# Altium schematic symbol library jlcpcb_2025_04_resistors_extended_0201.schlib: 1508 symbols (part 2 of 8)
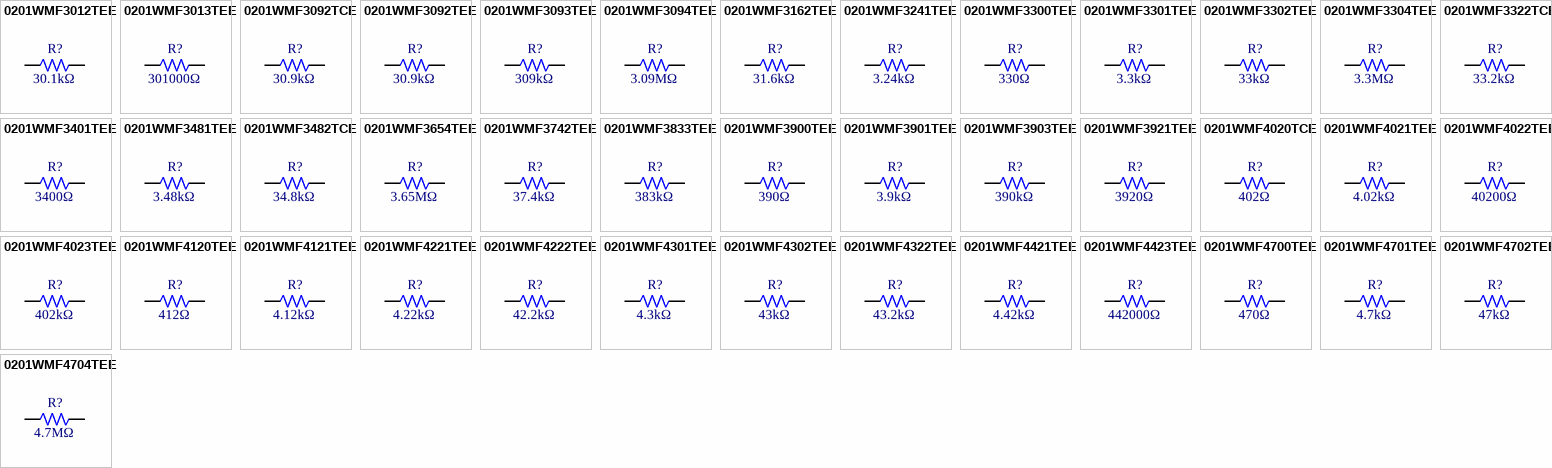
[diagram p38: symbols 0201WMF3012TEE to 0201WMF4704TEE]

## 0201WMF4421TEE
designator R?  Resistance: 4.42kΩ  (hidden comment: *)
Resistor, 4.42kΩ, ±1%, 50mW, 25V, ±200ppm/℃, -55℃~+155℃, SMD 0201; Manufacturer: Uniroyal; Manufacturer Part Number: 0201WMF4421TEE; Supplier 1: LCSC; Supplier Part Number 1: C423515; JLCPCB Part Number: C423515; Power Rating: 50mW; Category: Resistors; Package Size: 0201; JLCPCB Basic Part: Yes; Tolerance: ±1%; Voltage Rating: 25V; Temperature Coefficient: ±200ppm/℃; Temperature Rating: -55℃~+155℃; ComponentLink1Description: Datasheet; ComponentLink1URL: https://wmsc.lcsc.com/wmsc/upload/file/pdf/v2/lcsc/2205312145_UNI-ROYAL-Uniroyal-Elec-0201WMF4421TEE_C423515.pdf; ComponentLink2Description: JLCPCB Part URL; ComponentLink2URL: https://jlcpcb.com/partdetail/C423515
pins: 1, 2
1 alternate drawing of the same symbol

## 0201WMF4423TEE
designator R?  Resistance: 442000Ω  (hidden comment: *)
Resistor, 442000Ω, ±1%, 50mW, 25V, ±200ppm/℃, -55℃~+155℃, SMD 0201; Manufacturer: Uniroyal; Manufacturer Part Number: 0201WMF4423TEE; Supplier 1: LCSC; Supplier Part Number 1: C423513; JLCPCB Part Number: C423513; Power Rating: 50mW; Category: Resistors; Package Size: 0201; JLCPCB Basic Part: Yes; Tolerance: ±1%; Voltage Rating: 25V; Temperature Coefficient: ±200ppm/℃; Temperature Rating: -55℃~+155℃; ComponentLink1Description: Datasheet; ComponentLink1URL: https://wmsc.lcsc.com/wmsc/upload/file/pdf/v2/lcsc/2206011100_UNI-ROYAL-Uniroyal-Elec-0201WMF4423TEE_C423513.pdf; ComponentLink2Description: JLCPCB Part URL; ComponentLink2URL: https://jlcpcb.com/partdetail/C423513
pins: 1, 2
1 alternate drawing of the same symbol

## 0201WMF4700TEE
designator R?  Resistance: 470Ω  (hidden comment: *)
Resistor, 470Ω, ±1%, 50mW, 25V, ±200ppm/℃, -55℃~+155℃, SMD 0201; Manufacturer: Uniroyal; Manufacturer Part Number: 0201WMF4700TEE; Supplier 1: LCSC; Supplier Part Number 1: C473464; JLCPCB Part Number: C473464; Power Rating: 50mW; Category: Resistors; Package Size: 0201; JLCPCB Basic Part: Yes; Tolerance: ±1%; Voltage Rating: 25V; Temperature Coefficient: ±200ppm/℃; Temperature Rating: -55℃~+155℃; ComponentLink1Description: Datasheet; ComponentLink1URL: https://wmsc.lcsc.com/wmsc/upload/file/pdf/v2/lcsc/2205312145_UNI-ROYAL-Uniroyal-Elec-0201WMF4700TEE_C473464.pdf; ComponentLink2Description: JLCPCB Part URL; ComponentLink2URL: https://jlcpcb.com/partdetail/C473464
pins: 1, 2
1 alternate drawing of the same symbol

## 0201WMF4701TEE
designator R?  Resistance: 4.7kΩ  (hidden comment: *)
Resistor, 4.7kΩ, ±1%, 50mW, 25V, ±200ppm/℃, -55℃~+155℃, SMD 0201; Manufacturer: Uniroyal; Manufacturer Part Number: 0201WMF4701TEE; Supplier 1: LCSC; Supplier Part Number 1: C270346; JLCPCB Part Number: C270346; Power Rating: 50mW; Category: Resistors; Package Size: 0201; JLCPCB Basic Part: Yes; Tolerance: ±1%; Voltage Rating: 25V; Temperature Coefficient: ±200ppm/℃; Temperature Rating: -55℃~+155℃; ComponentLink1Description: Datasheet; ComponentLink1URL: https://wmsc.lcsc.com/wmsc/upload/file/pdf/v2/lcsc/2205311945_UNI-ROYAL-Uniroyal-Elec-0201WMF4701TEE_C270346.pdf; ComponentLink2Description: JLCPCB Part URL; ComponentLink2URL: https://jlcpcb.com/partdetail/C270346
pins: 1, 2
1 alternate drawing of the same symbol

## 0201WMF4702TEE
designator R?  Resistance: 47kΩ  (hidden comment: *)
Resistor, 47kΩ, ±1%, 50mW, 25V, ±200ppm/℃, -55℃~+155℃, SMD 0201; Manufacturer: Uniroyal; Manufacturer Part Number: 0201WMF4702TEE; Supplier 1: LCSC; Supplier Part Number 1: C270345; JLCPCB Part Number: C270345; Power Rating: 50mW; Category: Resistors; Package Size: 0201; JLCPCB Basic Part: Yes; Tolerance: ±1%; Voltage Rating: 25V; Temperature Coefficient: ±200ppm/℃; Temperature Rating: -55℃~+155℃; ComponentLink1Description: Datasheet; ComponentLink1URL: https://wmsc.lcsc.com/wmsc/upload/file/pdf/v2/lcsc/2205311945_UNI-ROYAL-Uniroyal-Elec-0201WMF4702TEE_C270345.pdf; ComponentLink2Description: JLCPCB Part URL; ComponentLink2URL: https://jlcpcb.com/partdetail/C270345
pins: 1, 2
1 alternate drawing of the same symbol

## 0201WMF4704TEE
designator R?  Resistance: 4.7MΩ  (hidden comment: *)
Resistor, 4.7MΩ, ±1%, 50mW, 25V, ±200ppm/℃, -55℃~+155℃, SMD 0201; Manufacturer: Uniroyal; Manufacturer Part Number: 0201WMF4704TEE; Supplier 1: LCSC; Supplier Part Number 1: C778408; JLCPCB Part Number: C778408; Power Rating: 50mW; Category: Resistors; Package Size: 0201; JLCPCB Basic Part: Yes; Tolerance: ±1%; Voltage Rating: 25V; Temperature Coefficient: ±200ppm/℃; Temperature Rating: -55℃~+155℃; ComponentLink1Description: Datasheet; ComponentLink1URL: https://wmsc.lcsc.com/wmsc/upload/file/pdf/v2/lcsc/2205312130_UNI-ROYAL-Uniroyal-Elec-0201WMF4704TEE_C778408.pdf; ComponentLink2Description: JLCPCB Part URL; ComponentLink2URL: https://jlcpcb.com/partdetail/C778408
pins: 1, 2
1 alternate drawing of the same symbol

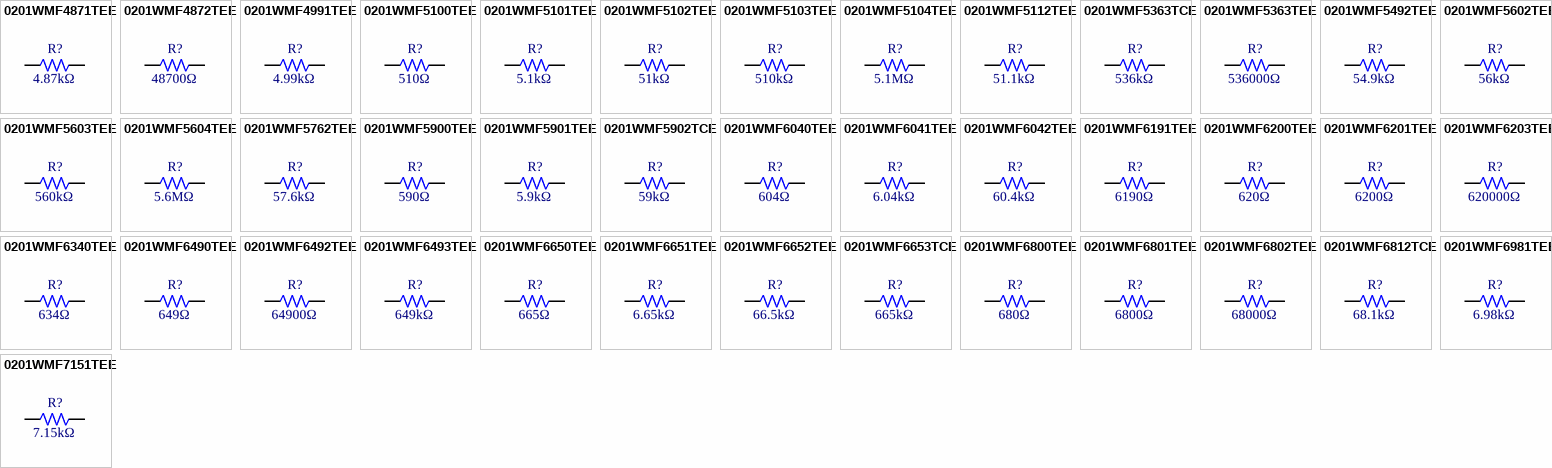
[diagram p5: symbols 0201WMF4871TEE to 0201WMF7151TEE]

## 0201WMF4871TEE
designator R?  Resistance: 4.87kΩ  (hidden comment: *)
Resistor, 4.87kΩ, ±1%, 50mW, 25V, ±200ppm/℃, -55℃~+155℃, SMD 0201; Manufacturer: Uniroyal; Manufacturer Part Number: 0201WMF4871TEE; Supplier 1: LCSC; Supplier Part Number 1: C423501; JLCPCB Part Number: C423501; Power Rating: 50mW; Category: Resistors; Package Size: 0201; JLCPCB Basic Part: Yes; Tolerance: ±1%; Voltage Rating: 25V; Temperature Coefficient: ±200ppm/℃; Temperature Rating: -55℃~+155℃; ComponentLink1Description: Datasheet; ComponentLink1URL: https://wmsc.lcsc.com/wmsc/upload/file/pdf/v2/lcsc/2205312145_UNI-ROYAL-Uniroyal-Elec-0201WMF4871TEE_C423501.pdf; ComponentLink2Description: JLCPCB Part URL; ComponentLink2URL: https://jlcpcb.com/partdetail/C423501
pins: 1, 2
1 alternate drawing of the same symbol

## 0201WMF4872TEE
designator R?  Resistance: 48700Ω  (hidden comment: *)
Resistor, 48700Ω, ±1%, 50mW, 25V, ±200ppm/℃, -55℃~+155℃, SMD 0201; Manufacturer: Uniroyal; Manufacturer Part Number: 0201WMF4872TEE; Supplier 1: LCSC; Supplier Part Number 1: C473629; JLCPCB Part Number: C473629; Power Rating: 50mW; Category: Resistors; Package Size: 0201; JLCPCB Basic Part: Yes; Tolerance: ±1%; Voltage Rating: 25V; Temperature Coefficient: ±200ppm/℃; Temperature Rating: -55℃~+155℃; ComponentLink1Description: Datasheet; ComponentLink1URL: https://wmsc.lcsc.com/wmsc/upload/file/pdf/v2/lcsc/2205312130_UNI-ROYAL-Uniroyal-Elec-0201WMF4872TEE_C473629.pdf; ComponentLink2Description: JLCPCB Part URL; ComponentLink2URL: https://jlcpcb.com/partdetail/C473629
pins: 1, 2
1 alternate drawing of the same symbol

## 0201WMF4991TEE
designator R?  Resistance: 4.99kΩ  (hidden comment: *)
Resistor, 4.99kΩ, ±1%, 50mW, 25V, ±200ppm/℃, -55℃~+155℃, SMD 0201; Manufacturer: Uniroyal; Manufacturer Part Number: 0201WMF4991TEE; Supplier 1: LCSC; Supplier Part Number 1: C473528; JLCPCB Part Number: C473528; Power Rating: 50mW; Category: Resistors; Package Size: 0201; JLCPCB Basic Part: Yes; Tolerance: ±1%; Voltage Rating: 25V; Temperature Coefficient: ±200ppm/℃; Temperature Rating: -55℃~+155℃; ComponentLink1Description: Datasheet; ComponentLink1URL: https://wmsc.lcsc.com/wmsc/upload/file/pdf/v2/lcsc/2205312145_UNI-ROYAL-Uniroyal-Elec-0201WMF4991TEE_C473528.pdf; ComponentLink2Description: JLCPCB Part URL; ComponentLink2URL: https://jlcpcb.com/partdetail/C473528
pins: 1, 2
1 alternate drawing of the same symbol

## 0201WMF5100TEE
designator R?  Resistance: 510Ω  (hidden comment: *)
Resistor, 510Ω, ±1%, 50mW, 25V, ±200ppm/℃, -55℃~+155℃, SMD 0201; Manufacturer: Uniroyal; Manufacturer Part Number: 0201WMF5100TEE; Supplier 1: LCSC; Supplier Part Number 1: C246901; JLCPCB Part Number: C246901; Power Rating: 50mW; Category: Resistors; Package Size: 0201; JLCPCB Basic Part: Yes; Tolerance: ±1%; Voltage Rating: 25V; Temperature Coefficient: ±200ppm/℃; Temperature Rating: -55℃~+155℃; ComponentLink1Description: Datasheet; ComponentLink1URL: https://wmsc.lcsc.com/wmsc/upload/file/pdf/v2/lcsc/2205311916_UNI-ROYAL-Uniroyal-Elec-0201WMF5100TEE_C246901.pdf; ComponentLink2Description: JLCPCB Part URL; ComponentLink2URL: https://jlcpcb.com/partdetail/C246901
pins: 1, 2
1 alternate drawing of the same symbol

## 0201WMF5101TEE
designator R?  Resistance: 5.1kΩ  (hidden comment: *)
Resistor, 5.1kΩ, ±1%, 50mW, 25V, ±200ppm/℃, -55℃~+155℃, SMD 0201; Manufacturer: Uniroyal; Manufacturer Part Number: 0201WMF5101TEE; Supplier 1: LCSC; Supplier Part Number 1: C270344; JLCPCB Part Number: C270344; Power Rating: 50mW; Category: Resistors; Package Size: 0201; JLCPCB Basic Part: Yes; Tolerance: ±1%; Voltage Rating: 25V; Temperature Coefficient: ±200ppm/℃; Temperature Rating: -55℃~+155℃; ComponentLink1Description: Datasheet; ComponentLink1URL: https://wmsc.lcsc.com/wmsc/upload/file/pdf/v2/lcsc/2205311945_UNI-ROYAL-Uniroyal-Elec-0201WMF5101TEE_C270344.pdf; ComponentLink2Description: JLCPCB Part URL; ComponentLink2URL: https://jlcpcb.com/partdetail/C270344
pins: 1, 2
1 alternate drawing of the same symbol

## 0201WMF5102TEE
designator R?  Resistance: 51kΩ  (hidden comment: *)
Resistor, 51kΩ, ±1%, 50mW, 25V, ±200ppm/℃, -55℃~+155℃, SMD 0201; Manufacturer: Uniroyal; Manufacturer Part Number: 0201WMF5102TEE; Supplier 1: LCSC; Supplier Part Number 1: C473471; JLCPCB Part Number: C473471; Power Rating: 50mW; Category: Resistors; Package Size: 0201; JLCPCB Basic Part: Yes; Tolerance: ±1%; Voltage Rating: 25V; Temperature Coefficient: ±200ppm/℃; Temperature Rating: -55℃~+155℃; ComponentLink1Description: Datasheet; ComponentLink1URL: https://wmsc.lcsc.com/wmsc/upload/file/pdf/v2/lcsc/2205312145_UNI-ROYAL-Uniroyal-Elec-0201WMF5102TEE_C473471.pdf; ComponentLink2Description: JLCPCB Part URL; ComponentLink2URL: https://jlcpcb.com/partdetail/C473471
pins: 1, 2
1 alternate drawing of the same symbol

## 0201WMF5103TEE
designator R?  Resistance: 510kΩ  (hidden comment: *)
Resistor, 510kΩ, ±1%, 50mW, 25V, ±200ppm/℃, -55℃~+155℃, SMD 0201; Manufacturer: Uniroyal; Manufacturer Part Number: 0201WMF5103TEE; Supplier 1: LCSC; Supplier Part Number 1: C423497; JLCPCB Part Number: C423497; Power Rating: 50mW; Category: Resistors; Package Size: 0201; JLCPCB Basic Part: Yes; Tolerance: ±1%; Voltage Rating: 25V; Temperature Coefficient: ±200ppm/℃; Temperature Rating: -55℃~+155℃; ComponentLink1Description: Datasheet; ComponentLink1URL: https://wmsc.lcsc.com/wmsc/upload/file/pdf/v2/lcsc/2205312030_UNI-ROYAL-Uniroyal-Elec-0201WMF5103TEE_C423497.pdf; ComponentLink2Description: JLCPCB Part URL; ComponentLink2URL: https://jlcpcb.com/partdetail/C423497
pins: 1, 2
1 alternate drawing of the same symbol

## 0201WMF5104TEE
designator R?  Resistance: 5.1MΩ  (hidden comment: *)
Resistor, 5.1MΩ, ±1%, 50mW, 25V, ±200ppm/℃, -55℃~+155℃, SMD 0201; Manufacturer: Uniroyal; Manufacturer Part Number: 0201WMF5104TEE; Supplier 1: LCSC; Supplier Part Number 1: C473530; JLCPCB Part Number: C473530; Power Rating: 50mW; Category: Resistors; Package Size: 0201; JLCPCB Basic Part: Yes; Tolerance: ±1%; Voltage Rating: 25V; Temperature Coefficient: ±200ppm/℃; Temperature Rating: -55℃~+155℃; ComponentLink1Description: Datasheet; ComponentLink1URL: https://wmsc.lcsc.com/wmsc/upload/file/pdf/v2/lcsc/2205312145_UNI-ROYAL-Uniroyal-Elec-0201WMF5104TEE_C473530.pdf; ComponentLink2Description: JLCPCB Part URL; ComponentLink2URL: https://jlcpcb.com/partdetail/C473530
pins: 1, 2
1 alternate drawing of the same symbol

## 0201WMF5112TEE
designator R?  Resistance: 51.1kΩ  (hidden comment: *)
Resistor, 51.1kΩ, ±1%, 50mW, 25V, ±200ppm/℃, -55℃~+155℃, SMD 0201; Manufacturer: Uniroyal; Manufacturer Part Number: 0201WMF5112TEE; Supplier 1: LCSC; Supplier Part Number 1: C473614; JLCPCB Part Number: C473614; Power Rating: 50mW; Category: Resistors; Package Size: 0201; JLCPCB Basic Part: Yes; Tolerance: ±1%; Voltage Rating: 25V; Temperature Coefficient: ±200ppm/℃; Temperature Rating: -55℃~+155℃; ComponentLink1Description: Datasheet; ComponentLink1URL: https://wmsc.lcsc.com/wmsc/upload/file/pdf/v2/lcsc/2205312130_UNI-ROYAL-Uniroyal-Elec-0201WMF5112TEE_C473614.pdf; ComponentLink2Description: JLCPCB Part URL; ComponentLink2URL: https://jlcpcb.com/partdetail/C473614
pins: 1, 2
1 alternate drawing of the same symbol

## 0201WMF5363TCE
designator R?  Resistance: 536kΩ  (hidden comment: *)
Resistor, 536kΩ, ±1%, 50mW, 25V, ±200ppm/℃, -55℃~+155℃, SMD 0201; Manufacturer: Uniroyal; Manufacturer Part Number: 0201WMF5363TCE; Supplier 1: LCSC; Supplier Part Number 1: C246899; JLCPCB Part Number: C246899; Power Rating: 50mW; Category: Resistors; Package Size: 0201; JLCPCB Basic Part: Yes; Tolerance: ±1%; Voltage Rating: 25V; Temperature Coefficient: ±200ppm/℃; Temperature Rating: -55℃~+155℃; ComponentLink1Description: Datasheet; ComponentLink1URL: https://wmsc.lcsc.com/wmsc/upload/file/pdf/v2/lcsc/2205311916_UNI-ROYAL-Uniroyal-Elec-0201WMF5363TCE_C246899.pdf; ComponentLink2Description: JLCPCB Part URL; ComponentLink2URL: https://jlcpcb.com/partdetail/C246899
pins: 1, 2
1 alternate drawing of the same symbol

## 0201WMF5363TEE
designator R?  Resistance: 536000Ω  (hidden comment: *)
Resistor, 536000Ω, ±1%, 50mW, 25V, -55℃~+155℃, SMD 0201; Manufacturer: Uniroyal; Manufacturer Part Number: 0201WMF5363TEE; Supplier 1: LCSC; Supplier Part Number 1: C423487; JLCPCB Part Number: C423487; Power Rating: 50mW; Category: Resistors; Package Size: 0201; JLCPCB Basic Part: Yes; Tolerance: ±1%; Voltage Rating: 25V; Temperature Rating: -55℃~+155℃; ComponentLink1Description: Datasheet; ComponentLink1URL: https://wmsc.lcsc.com/wmsc/upload/file/pdf/v2/lcsc/2207141800_UNI-ROYAL-Uniroyal-Elec-0201WMF5363TEE_C423487.pdf; ComponentLink2Description: JLCPCB Part URL; ComponentLink2URL: https://jlcpcb.com/partdetail/C423487
pins: 1, 2
1 alternate drawing of the same symbol

## 0201WMF5492TEE
designator R?  Resistance: 54.9kΩ  (hidden comment: *)
Resistor, 54.9kΩ, ±1%, 50mW, 25V, ±200ppm/℃, -55℃~+155℃, SMD 0201; Manufacturer: Uniroyal; Manufacturer Part Number: 0201WMF5492TEE; Supplier 1: LCSC; Supplier Part Number 1: C474117; JLCPCB Part Number: C474117; Power Rating: 50mW; Category: Resistors; Package Size: 0201; JLCPCB Basic Part: Yes; Tolerance: ±1%; Voltage Rating: 25V; Temperature Coefficient: ±200ppm/℃; Temperature Rating: -55℃~+155℃; ComponentLink1Description: Datasheet; ComponentLink1URL: https://wmsc.lcsc.com/wmsc/upload/file/pdf/v2/lcsc/2205312030_UNI-ROYAL-Uniroyal-Elec-0201WMF5492TEE_C474117.pdf; ComponentLink2Description: JLCPCB Part URL; ComponentLink2URL: https://jlcpcb.com/partdetail/C474117
pins: 1, 2
1 alternate drawing of the same symbol

## 0201WMF5602TEE
designator R?  Resistance: 56kΩ  (hidden comment: *)
Resistor, 56kΩ, ±1%, 50mW, 25V, ±200ppm/℃, -55℃~+155℃, SMD 0201; Manufacturer: Uniroyal; Manufacturer Part Number: 0201WMF5602TEE; Supplier 1: LCSC; Supplier Part Number 1: C473524; JLCPCB Part Number: C473524; Power Rating: 50mW; Category: Resistors; Package Size: 0201; JLCPCB Basic Part: Yes; Tolerance: ±1%; Voltage Rating: 25V; Temperature Coefficient: ±200ppm/℃; Temperature Rating: -55℃~+155℃; ComponentLink1Description: Datasheet; ComponentLink1URL: https://wmsc.lcsc.com/wmsc/upload/file/pdf/v2/lcsc/2205312145_UNI-ROYAL-Uniroyal-Elec-0201WMF5602TEE_C473524.pdf; ComponentLink2Description: JLCPCB Part URL; ComponentLink2URL: https://jlcpcb.com/partdetail/C473524
pins: 1, 2
1 alternate drawing of the same symbol

## 0201WMF5603TEE
designator R?  Resistance: 560kΩ  (hidden comment: *)
Resistor, 560kΩ, ±1%, 50mW, 25V, ±200ppm/℃, -55℃~+155℃, SMD 0201; Manufacturer: Uniroyal; Manufacturer Part Number: 0201WMF5603TEE; Supplier 1: LCSC; Supplier Part Number 1: C473500; JLCPCB Part Number: C473500; Power Rating: 50mW; Category: Resistors; Package Size: 0201; JLCPCB Basic Part: Yes; Tolerance: ±1%; Voltage Rating: 25V; Temperature Coefficient: ±200ppm/℃; Temperature Rating: -55℃~+155℃; ComponentLink1Description: Datasheet; ComponentLink1URL: https://wmsc.lcsc.com/wmsc/upload/file/pdf/v2/lcsc/2205312030_UNI-ROYAL-Uniroyal-Elec-0201WMF5603TEE_C473500.pdf; ComponentLink2Description: JLCPCB Part URL; ComponentLink2URL: https://jlcpcb.com/partdetail/C473500
pins: 1, 2
1 alternate drawing of the same symbol

## 0201WMF5604TEE
designator R?  Resistance: 5.6MΩ  (hidden comment: *)
Resistor, 5.6MΩ, ±1%, 50mW, 25V, ±200ppm/℃, -55℃~+155℃, SMD 0201; Manufacturer: Uniroyal; Manufacturer Part Number: 0201WMF5604TEE; Supplier 1: LCSC; Supplier Part Number 1: C784162; JLCPCB Part Number: C784162; Power Rating: 50mW; Category: Resistors; Package Size: 0201; JLCPCB Basic Part: Yes; Tolerance: ±1%; Voltage Rating: 25V; Temperature Coefficient: ±200ppm/℃; Temperature Rating: -55℃~+155℃; ComponentLink1Description: Datasheet; ComponentLink1URL: https://wmsc.lcsc.com/wmsc/upload/file/pdf/v2/lcsc/2205312045_UNI-ROYAL-Uniroyal-Elec-0201WMF5604TEE_C784162.pdf; ComponentLink2Description: JLCPCB Part URL; ComponentLink2URL: https://jlcpcb.com/partdetail/C784162
pins: 1, 2
1 alternate drawing of the same symbol

## 0201WMF5762TEE
designator R?  Resistance: 57.6kΩ  (hidden comment: *)
Resistor, 57.6kΩ, ±1%, 50mW, 25V, ±200ppm/℃, -55℃~+155℃, SMD 0201; Manufacturer: Uniroyal; Manufacturer Part Number: 0201WMF5762TEE; Supplier 1: LCSC; Supplier Part Number 1: C423476; JLCPCB Part Number: C423476; Power Rating: 50mW; Category: Resistors; Package Size: 0201; JLCPCB Basic Part: Yes; Tolerance: ±1%; Voltage Rating: 25V; Temperature Coefficient: ±200ppm/℃; Temperature Rating: -55℃~+155℃; ComponentLink1Description: Datasheet; ComponentLink1URL: https://wmsc.lcsc.com/wmsc/upload/file/pdf/v2/lcsc/2205312145_UNI-ROYAL-Uniroyal-Elec-0201WMF5762TEE_C423476.pdf; ComponentLink2Description: JLCPCB Part URL; ComponentLink2URL: https://jlcpcb.com/partdetail/C423476
pins: 1, 2
1 alternate drawing of the same symbol

## 0201WMF5900TEE
designator R?  Resistance: 590Ω  (hidden comment: *)
Resistor, 590Ω, ±1%, 50mW, 25V, ±200ppm/℃, -55℃~+155℃, SMD 0201; Manufacturer: Uniroyal; Manufacturer Part Number: 0201WMF5900TEE; Supplier 1: LCSC; Supplier Part Number 1: C474302; JLCPCB Part Number: C474302; Power Rating: 50mW; Category: Resistors; Package Size: 0201; JLCPCB Basic Part: Yes; Tolerance: ±1%; Voltage Rating: 25V; Temperature Coefficient: ±200ppm/℃; Temperature Rating: -55℃~+155℃; ComponentLink1Description: Datasheet; ComponentLink1URL: https://wmsc.lcsc.com/wmsc/upload/file/pdf/v2/lcsc/2205312045_UNI-ROYAL-Uniroyal-Elec-0201WMF5900TEE_C474302.pdf; ComponentLink2Description: JLCPCB Part URL; ComponentLink2URL: https://jlcpcb.com/partdetail/C474302
pins: 1, 2
1 alternate drawing of the same symbol

## 0201WMF5901TEE
designator R?  Resistance: 5.9kΩ  (hidden comment: *)
Resistor, 5.9kΩ, ±1%, 50mW, 25V, ±200ppm/℃, -55℃~+155℃, SMD 0201; Manufacturer: Uniroyal; Manufacturer Part Number: 0201WMF5901TEE; Supplier 1: LCSC; Supplier Part Number 1: C473657; JLCPCB Part Number: C473657; Power Rating: 50mW; Category: Resistors; Package Size: 0201; JLCPCB Basic Part: Yes; Tolerance: ±1%; Voltage Rating: 25V; Temperature Coefficient: ±200ppm/℃; Temperature Rating: -55℃~+155℃; ComponentLink1Description: Datasheet; ComponentLink1URL: https://wmsc.lcsc.com/wmsc/upload/file/pdf/v2/lcsc/2205312130_UNI-ROYAL-Uniroyal-Elec-0201WMF5901TEE_C473657.pdf; ComponentLink2Description: JLCPCB Part URL; ComponentLink2URL: https://jlcpcb.com/partdetail/C473657
pins: 1, 2
1 alternate drawing of the same symbol

## 0201WMF5902TCE
designator R?  Resistance: 59kΩ  (hidden comment: *)
Resistor, 59kΩ, ±1%, 50mW, 25V, ±200ppm/℃, -55℃~+155℃, SMD 0201; Manufacturer: Uniroyal; Manufacturer Part Number: 0201WMF5902TCE; Supplier 1: LCSC; Supplier Part Number 1: C407764; JLCPCB Part Number: C407764; Power Rating: 50mW; Category: Resistors; Package Size: 0201; JLCPCB Basic Part: Yes; Tolerance: ±1%; Voltage Rating: 25V; Temperature Coefficient: ±200ppm/℃; Temperature Rating: -55℃~+155℃; ComponentLink1Description: Datasheet; ComponentLink1URL: https://wmsc.lcsc.com/wmsc/upload/file/pdf/v2/lcsc/2205312245_UNI-ROYAL-Uniroyal-Elec-0201WMF5902TCE_C407764.pdf; ComponentLink2Description: JLCPCB Part URL; ComponentLink2URL: https://jlcpcb.com/partdetail/C407764
pins: 1, 2
1 alternate drawing of the same symbol

## 0201WMF6040TEE
designator R?  Resistance: 604Ω  (hidden comment: *)
Resistor, 604Ω, ±1%, 50mW, SMD 0201; Manufacturer: Uniroyal; Manufacturer Part Number: 0201WMF6040TEE; Supplier 1: LCSC; Supplier Part Number 1: C423470; JLCPCB Part Number: C423470; Power Rating: 50mW; Category: Resistors; Package Size: 0201; JLCPCB Basic Part: Yes; Tolerance: ±1%; ComponentLink1Description: Datasheet; ComponentLink1URL: https://wmsc.lcsc.com/wmsc/upload/file/pdf/v2/lcsc/2306071622_UNI-ROYAL-Uniroyal-Elec-0201WMF6040TEE_C423470.pdf; ComponentLink2Description: JLCPCB Part URL; ComponentLink2URL: https://jlcpcb.com/partdetail/C423470
pins: 1, 2
1 alternate drawing of the same symbol

## 0201WMF6041TEE
designator R?  Resistance: 6.04kΩ  (hidden comment: *)
Resistor, 6.04kΩ, ±1%, 50mW, 25V, ±200ppm/℃, -55℃~+155℃, SMD 0201; Manufacturer: Uniroyal; Manufacturer Part Number: 0201WMF6041TEE; Supplier 1: LCSC; Supplier Part Number 1: C270341; JLCPCB Part Number: C270341; Power Rating: 50mW; Category: Resistors; Package Size: 0201; JLCPCB Basic Part: Yes; Tolerance: ±1%; Voltage Rating: 25V; Temperature Coefficient: ±200ppm/℃; Temperature Rating: -55℃~+155℃; ComponentLink1Description: Datasheet; ComponentLink1URL: https://wmsc.lcsc.com/wmsc/upload/file/pdf/v2/lcsc/2205311945_UNI-ROYAL-Uniroyal-Elec-0201WMF6041TEE_C270341.pdf; ComponentLink2Description: JLCPCB Part URL; ComponentLink2URL: https://jlcpcb.com/partdetail/C270341
pins: 1, 2
1 alternate drawing of the same symbol

## 0201WMF6042TEE
designator R?  Resistance: 60.4kΩ  (hidden comment: *)
Resistor, 60.4kΩ, ±1%, 50mW, 25V, ±200ppm/℃, -55℃~+155℃, SMD 0201; Manufacturer: Uniroyal; Manufacturer Part Number: 0201WMF6042TEE; Supplier 1: LCSC; Supplier Part Number 1: C473653; JLCPCB Part Number: C473653; Power Rating: 50mW; Category: Resistors; Package Size: 0201; JLCPCB Basic Part: Yes; Tolerance: ±1%; Voltage Rating: 25V; Temperature Coefficient: ±200ppm/℃; Temperature Rating: -55℃~+155℃; ComponentLink1Description: Datasheet; ComponentLink1URL: https://wmsc.lcsc.com/wmsc/upload/file/pdf/v2/lcsc/2205312030_UNI-ROYAL-Uniroyal-Elec-0201WMF6042TEE_C473653.pdf; ComponentLink2Description: JLCPCB Part URL; ComponentLink2URL: https://jlcpcb.com/partdetail/C473653
pins: 1, 2
1 alternate drawing of the same symbol

## 0201WMF6191TEE
designator R?  Resistance: 6190Ω  (hidden comment: *)
Resistor, 6190Ω, ±1%, 50mW, 25V, ±200ppm/℃, -55℃~+155℃, SMD 0201; Manufacturer: Uniroyal; Manufacturer Part Number: 0201WMF6191TEE; Supplier 1: LCSC; Supplier Part Number 1: C423468; JLCPCB Part Number: C423468; Power Rating: 50mW; Category: Resistors; Package Size: 0201; JLCPCB Basic Part: Yes; Tolerance: ±1%; Voltage Rating: 25V; Temperature Coefficient: ±200ppm/℃; Temperature Rating: -55℃~+155℃; ComponentLink1Description: Datasheet; ComponentLink1URL: https://wmsc.lcsc.com/wmsc/upload/file/pdf/v2/lcsc/2205312145_UNI-ROYAL-Uniroyal-Elec-0201WMF6191TEE_C423468.pdf; ComponentLink2Description: JLCPCB Part URL; ComponentLink2URL: https://jlcpcb.com/partdetail/C423468
pins: 1, 2
1 alternate drawing of the same symbol

## 0201WMF6200TEE
designator R?  Resistance: 620Ω  (hidden comment: *)
Resistor, 620Ω, ±1%, 50mW, 25V, ±200ppm/℃, -55℃~+155℃, SMD 0201; Manufacturer: Uniroyal; Manufacturer Part Number: 0201WMF6200TEE; Supplier 1: LCSC; Supplier Part Number 1: C423465; JLCPCB Part Number: C423465; Power Rating: 50mW; Category: Resistors; Package Size: 0201; JLCPCB Basic Part: Yes; Tolerance: ±1%; Voltage Rating: 25V; Temperature Coefficient: ±200ppm/℃; Temperature Rating: -55℃~+155℃; ComponentLink1Description: Datasheet; ComponentLink1URL: https://wmsc.lcsc.com/wmsc/upload/file/pdf/v2/lcsc/2205312030_UNI-ROYAL-Uniroyal-Elec-0201WMF6200TEE_C423465.pdf; ComponentLink2Description: JLCPCB Part URL; ComponentLink2URL: https://jlcpcb.com/partdetail/C423465
pins: 1, 2
1 alternate drawing of the same symbol

## 0201WMF6201TEE
designator R?  Resistance: 6200Ω  (hidden comment: *)
Resistor, 6200Ω, ±1%, 50mW, 25V, ±200ppm/℃, -55℃~+155℃, SMD 0201; Manufacturer: Uniroyal; Manufacturer Part Number: 0201WMF6201TEE; Supplier 1: LCSC; Supplier Part Number 1: C423464; JLCPCB Part Number: C423464; Power Rating: 50mW; Category: Resistors; Package Size: 0201; JLCPCB Basic Part: Yes; Tolerance: ±1%; Voltage Rating: 25V; Temperature Coefficient: ±200ppm/℃; Temperature Rating: -55℃~+155℃; ComponentLink1Description: Datasheet; ComponentLink1URL: https://wmsc.lcsc.com/wmsc/upload/file/pdf/v2/lcsc/2205312145_UNI-ROYAL-Uniroyal-Elec-0201WMF6201TEE_C423464.pdf; ComponentLink2Description: JLCPCB Part URL; ComponentLink2URL: https://jlcpcb.com/partdetail/C423464
pins: 1, 2
1 alternate drawing of the same symbol

## 0201WMF6203TEE
designator R?  Resistance: 620000Ω  (hidden comment: *)
Resistor, 620000Ω, ±1%, 50mW, 25V, ±200ppm/℃, -55℃~+155℃, SMD 0201; Manufacturer: Uniroyal; Manufacturer Part Number: 0201WMF6203TEE; Supplier 1: LCSC; Supplier Part Number 1: C423463; JLCPCB Part Number: C423463; Power Rating: 50mW; Category: Resistors; Package Size: 0201; JLCPCB Basic Part: Yes; Tolerance: ±1%; Voltage Rating: 25V; Temperature Coefficient: ±200ppm/℃; Temperature Rating: -55℃~+155℃; ComponentLink1Description: Datasheet; ComponentLink1URL: https://wmsc.lcsc.com/wmsc/upload/file/pdf/v2/lcsc/2205312145_UNI-ROYAL-Uniroyal-Elec-0201WMF6203TEE_C423463.pdf; ComponentLink2Description: JLCPCB Part URL; ComponentLink2URL: https://jlcpcb.com/partdetail/C423463
pins: 1, 2
1 alternate drawing of the same symbol

## 0201WMF6340TEE
designator R?  Resistance: 634Ω  (hidden comment: *)
Resistor, 634Ω, ±1%, 50mW, 25V, ±200ppm/℃, -55℃~+155℃, SMD 0201; Manufacturer: Uniroyal; Manufacturer Part Number: 0201WMF6340TEE; Supplier 1: LCSC; Supplier Part Number 1: C423459; JLCPCB Part Number: C423459; Power Rating: 50mW; Category: Resistors; Package Size: 0201; JLCPCB Basic Part: Yes; Tolerance: ±1%; Voltage Rating: 25V; Temperature Coefficient: ±200ppm/℃; Temperature Rating: -55℃~+155℃; ComponentLink1Description: Datasheet; ComponentLink1URL: https://wmsc.lcsc.com/wmsc/upload/file/pdf/v2/lcsc/2205312145_UNI-ROYAL-Uniroyal-Elec-0201WMF6340TEE_C423459.pdf; ComponentLink2Description: JLCPCB Part URL; ComponentLink2URL: https://jlcpcb.com/partdetail/C423459
pins: 1, 2
1 alternate drawing of the same symbol

## 0201WMF6490TEE
designator R?  Resistance: 649Ω  (hidden comment: *)
Resistor, 649Ω, ±1%, 50mW, 25V, ±200ppm/℃, -55℃~+155℃, SMD 0201; Manufacturer: Uniroyal; Manufacturer Part Number: 0201WMF6490TEE; Supplier 1: LCSC; Supplier Part Number 1: C473633; JLCPCB Part Number: C473633; Power Rating: 50mW; Category: Resistors; Package Size: 0201; JLCPCB Basic Part: Yes; Tolerance: ±1%; Voltage Rating: 25V; Temperature Coefficient: ±200ppm/℃; Temperature Rating: -55℃~+155℃; ComponentLink1Description: Datasheet; ComponentLink1URL: https://wmsc.lcsc.com/wmsc/upload/file/pdf/v2/lcsc/2205312130_UNI-ROYAL-Uniroyal-Elec-0201WMF6490TEE_C473633.pdf; ComponentLink2Description: JLCPCB Part URL; ComponentLink2URL: https://jlcpcb.com/partdetail/C473633
pins: 1, 2
1 alternate drawing of the same symbol

## 0201WMF6492TEE
designator R?  Resistance: 64900Ω  (hidden comment: *)
Resistor, 64900Ω, ±1%, 50mW, 25V, ±200ppm/℃, -55℃~+155℃, SMD 0201; Manufacturer: Uniroyal; Manufacturer Part Number: 0201WMF6492TEE; Supplier 1: LCSC; Supplier Part Number 1: C423455; JLCPCB Part Number: C423455; Power Rating: 50mW; Category: Resistors; Package Size: 0201; JLCPCB Basic Part: Yes; Tolerance: ±1%; Voltage Rating: 25V; Temperature Coefficient: ±200ppm/℃; Temperature Rating: -55℃~+155℃; ComponentLink1Description: Datasheet; ComponentLink1URL: https://wmsc.lcsc.com/wmsc/upload/file/pdf/v2/lcsc/2205312145_UNI-ROYAL-Uniroyal-Elec-0201WMF6492TEE_C423455.pdf; ComponentLink2Description: JLCPCB Part URL; ComponentLink2URL: https://jlcpcb.com/partdetail/C423455
pins: 1, 2
1 alternate drawing of the same symbol

## 0201WMF6493TEE
designator R?  Resistance: 649kΩ  (hidden comment: *)
Resistor, 649kΩ, ±1%, 50mW, 25V, ±200ppm/℃, -55℃~+155℃, SMD 0201; Manufacturer: Uniroyal; Manufacturer Part Number: 0201WMF6493TEE; Supplier 1: LCSC; Supplier Part Number 1: C473572; JLCPCB Part Number: C473572; Power Rating: 50mW; Category: Resistors; Package Size: 0201; JLCPCB Basic Part: Yes; Tolerance: ±1%; Voltage Rating: 25V; Temperature Coefficient: ±200ppm/℃; Temperature Rating: -55℃~+155℃; ComponentLink1Description: Datasheet; ComponentLink1URL: https://wmsc.lcsc.com/wmsc/upload/file/pdf/v2/lcsc/2205312145_UNI-ROYAL-Uniroyal-Elec-0201WMF6493TEE_C473572.pdf; ComponentLink2Description: JLCPCB Part URL; ComponentLink2URL: https://jlcpcb.com/partdetail/C473572
pins: 1, 2
1 alternate drawing of the same symbol

## 0201WMF6650TEE
designator R?  Resistance: 665Ω  (hidden comment: *)
Resistor, 665Ω, ±1%, 50mW, 25V, ±200ppm/℃, -55℃~+155℃, SMD 0201; Manufacturer: Uniroyal; Manufacturer Part Number: 0201WMF6650TEE; Supplier 1: LCSC; Supplier Part Number 1: C423453; JLCPCB Part Number: C423453; Power Rating: 50mW; Category: Resistors; Package Size: 0201; JLCPCB Basic Part: Yes; Tolerance: ±1%; Voltage Rating: 25V; Temperature Coefficient: ±200ppm/℃; Temperature Rating: -55℃~+155℃; ComponentLink1Description: Datasheet; ComponentLink1URL: https://wmsc.lcsc.com/wmsc/upload/file/pdf/v2/lcsc/2205312030_UNI-ROYAL-Uniroyal-Elec-0201WMF6650TEE_C423453.pdf; ComponentLink2Description: JLCPCB Part URL; ComponentLink2URL: https://jlcpcb.com/partdetail/C423453
pins: 1, 2
1 alternate drawing of the same symbol

## 0201WMF6651TEE
designator R?  Resistance: 6.65kΩ  (hidden comment: *)
Resistor, 6.65kΩ, ±1%, 50mW, 25V, -55℃~+155℃, SMD 0201; Manufacturer: Uniroyal; Manufacturer Part Number: 0201WMF6651TEE; Supplier 1: LCSC; Supplier Part Number 1: C423452; JLCPCB Part Number: C423452; Power Rating: 50mW; Category: Resistors; Package Size: 0201; JLCPCB Basic Part: Yes; Tolerance: ±1%; Voltage Rating: 25V; Temperature Rating: -55℃~+155℃; ComponentLink1Description: Datasheet; ComponentLink1URL: https://wmsc.lcsc.com/wmsc/upload/file/pdf/v2/lcsc/2306071622_UNI-ROYAL-Uniroyal-Elec-0201WMF6651TEE_C423452.pdf; ComponentLink2Description: JLCPCB Part URL; ComponentLink2URL: https://jlcpcb.com/partdetail/C423452
pins: 1, 2
1 alternate drawing of the same symbol

## 0201WMF6652TEE
designator R?  Resistance: 66.5kΩ  (hidden comment: *)
Resistor, 66.5kΩ, ±1%, 50mW, 25V, ±200ppm/℃, -55℃~+155℃, SMD 0201; Manufacturer: Uniroyal; Manufacturer Part Number: 0201WMF6652TEE; Supplier 1: LCSC; Supplier Part Number 1: C62193; JLCPCB Part Number: C62193; Power Rating: 50mW; Category: Resistors; Package Size: 0201; JLCPCB Basic Part: Yes; Tolerance: ±1%; Voltage Rating: 25V; Temperature Coefficient: ±200ppm/℃; Temperature Rating: -55℃~+155℃; ComponentLink1Description: Datasheet; ComponentLink1URL: https://wmsc.lcsc.com/wmsc/upload/file/pdf/v2/lcsc/2205312345_UNI-ROYAL-Uniroyal-Elec-0201WMF6652TEE_C62193.pdf; ComponentLink2Description: JLCPCB Part URL; ComponentLink2URL: https://jlcpcb.com/partdetail/C62193
pins: 1, 2
1 alternate drawing of the same symbol

## 0201WMF6653TCE
designator R?  Resistance: 665kΩ  (hidden comment: *)
Resistor, 665kΩ, ±1%, 50mW, 25V, ±200ppm/℃, -55℃~+155℃, SMD 0201; Manufacturer: Uniroyal; Manufacturer Part Number: 0201WMF6653TCE; Supplier 1: LCSC; Supplier Part Number 1: C60261; JLCPCB Part Number: C60261; Power Rating: 50mW; Category: Resistors; Package Size: 0201; JLCPCB Basic Part: Yes; Tolerance: ±1%; Voltage Rating: 25V; Temperature Coefficient: ±200ppm/℃; Temperature Rating: -55℃~+155℃; ComponentLink1Description: Datasheet; ComponentLink1URL: https://wmsc.lcsc.com/wmsc/upload/file/pdf/v2/lcsc/2205312345_UNI-ROYAL-Uniroyal-Elec-0201WMF6653TCE_C60261.pdf; ComponentLink2Description: JLCPCB Part URL; ComponentLink2URL: https://jlcpcb.com/partdetail/C60261
pins: 1, 2
1 alternate drawing of the same symbol

## 0201WMF6800TEE
designator R?  Resistance: 680Ω  (hidden comment: *)
Resistor, 680Ω, ±1%, 50mW, 25V, ±200ppm/℃, -55℃~+155℃, SMD 0201; Manufacturer: Uniroyal; Manufacturer Part Number: 0201WMF6800TEE; Supplier 1: LCSC; Supplier Part Number 1: C473509; JLCPCB Part Number: C473509; Power Rating: 50mW; Category: Resistors; Package Size: 0201; JLCPCB Basic Part: Yes; Tolerance: ±1%; Voltage Rating: 25V; Temperature Coefficient: ±200ppm/℃; Temperature Rating: -55℃~+155℃; ComponentLink1Description: Datasheet; ComponentLink1URL: https://wmsc.lcsc.com/wmsc/upload/file/pdf/v2/lcsc/2205312145_UNI-ROYAL-Uniroyal-Elec-0201WMF6800TEE_C473509.pdf; ComponentLink2Description: JLCPCB Part URL; ComponentLink2URL: https://jlcpcb.com/partdetail/C473509
pins: 1, 2
1 alternate drawing of the same symbol

## 0201WMF6801TEE
designator R?  Resistance: 6800Ω  (hidden comment: *)
Resistor, 6800Ω, ±1%, 50mW, 25V, ±200ppm/℃, -55℃~+155℃, SMD 0201; Manufacturer: Uniroyal; Manufacturer Part Number: 0201WMF6801TEE; Supplier 1: LCSC; Supplier Part Number 1: C423451; JLCPCB Part Number: C423451; Power Rating: 50mW; Category: Resistors; Package Size: 0201; JLCPCB Basic Part: Yes; Tolerance: ±1%; Voltage Rating: 25V; Temperature Coefficient: ±200ppm/℃; Temperature Rating: -55℃~+155℃; ComponentLink1Description: Datasheet; ComponentLink1URL: https://wmsc.lcsc.com/wmsc/upload/file/pdf/v2/lcsc/2205312145_UNI-ROYAL-Uniroyal-Elec-0201WMF6801TEE_C423451.pdf; ComponentLink2Description: JLCPCB Part URL; ComponentLink2URL: https://jlcpcb.com/partdetail/C423451
pins: 1, 2
1 alternate drawing of the same symbol

## 0201WMF6802TEE
designator R?  Resistance: 68000Ω  (hidden comment: *)
Resistor, 68000Ω, ±1%, 50mW, 25V, ±200ppm/℃, -55℃~+155℃, SMD 0201; Manufacturer: Uniroyal; Manufacturer Part Number: 0201WMF6802TEE; Supplier 1: LCSC; Supplier Part Number 1: C423450; JLCPCB Part Number: C423450; Power Rating: 50mW; Category: Resistors; Package Size: 0201; JLCPCB Basic Part: Yes; Tolerance: ±1%; Voltage Rating: 25V; Temperature Coefficient: ±200ppm/℃; Temperature Rating: -55℃~+155℃; ComponentLink1Description: Datasheet; ComponentLink1URL: https://wmsc.lcsc.com/wmsc/upload/file/pdf/v2/lcsc/2205312145_UNI-ROYAL-Uniroyal-Elec-0201WMF6802TEE_C423450.pdf; ComponentLink2Description: JLCPCB Part URL; ComponentLink2URL: https://jlcpcb.com/partdetail/C423450
pins: 1, 2
1 alternate drawing of the same symbol

## 0201WMF6812TCE
designator R?  Resistance: 68.1kΩ  (hidden comment: *)
Resistor, 68.1kΩ, ±1%, 50mW, 25V, ±200ppm/℃, -55℃~+155℃, SMD 0201; Manufacturer: Uniroyal; Manufacturer Part Number: 0201WMF6812TCE; Supplier 1: LCSC; Supplier Part Number 1: C270696; JLCPCB Part Number: C270696; Power Rating: 50mW; Category: Resistors; Package Size: 0201; JLCPCB Basic Part: Yes; Tolerance: ±1%; Voltage Rating: 25V; Temperature Coefficient: ±200ppm/℃; Temperature Rating: -55℃~+155℃; ComponentLink1Description: Datasheet; ComponentLink1URL: https://wmsc.lcsc.com/wmsc/upload/file/pdf/v2/lcsc/2205311945_UNI-ROYAL-Uniroyal-Elec-0201WMF6812TCE_C270696.pdf; ComponentLink2Description: JLCPCB Part URL; ComponentLink2URL: https://jlcpcb.com/partdetail/C270696
pins: 1, 2
1 alternate drawing of the same symbol

## 0201WMF6981TEE
designator R?  Resistance: 6.98kΩ  (hidden comment: *)
Resistor, 6.98kΩ, ±1%, 50mW, 25V, ±200ppm/℃, -55℃~+155℃, SMD 0201; Manufacturer: Uniroyal; Manufacturer Part Number: 0201WMF6981TEE; Supplier 1: LCSC; Supplier Part Number 1: C473436; JLCPCB Part Number: C473436; Power Rating: 50mW; Category: Resistors; Package Size: 0201; JLCPCB Basic Part: Yes; Tolerance: ±1%; Voltage Rating: 25V; Temperature Coefficient: ±200ppm/℃; Temperature Rating: -55℃~+155℃; ComponentLink1Description: Datasheet; ComponentLink1URL: https://wmsc.lcsc.com/wmsc/upload/file/pdf/v2/lcsc/2205312145_UNI-ROYAL-Uniroyal-Elec-0201WMF6981TEE_C473436.pdf; ComponentLink2Description: JLCPCB Part URL; ComponentLink2URL: https://jlcpcb.com/partdetail/C473436
pins: 1, 2
1 alternate drawing of the same symbol
